# Altium footprint library TarabusLibrary.PcbLib: 591 footprints (part 33 of 37)
Each footprint in its own frame and in the unit in brackets; x right, y up, seen from the top. Pads: shape width x height; smd on the part's side, far side on the other; paste and mask are expansions set on the pad; w line width, h text height; cw(c..) or ccw(c..) is an arc to the next point about the centre after c.
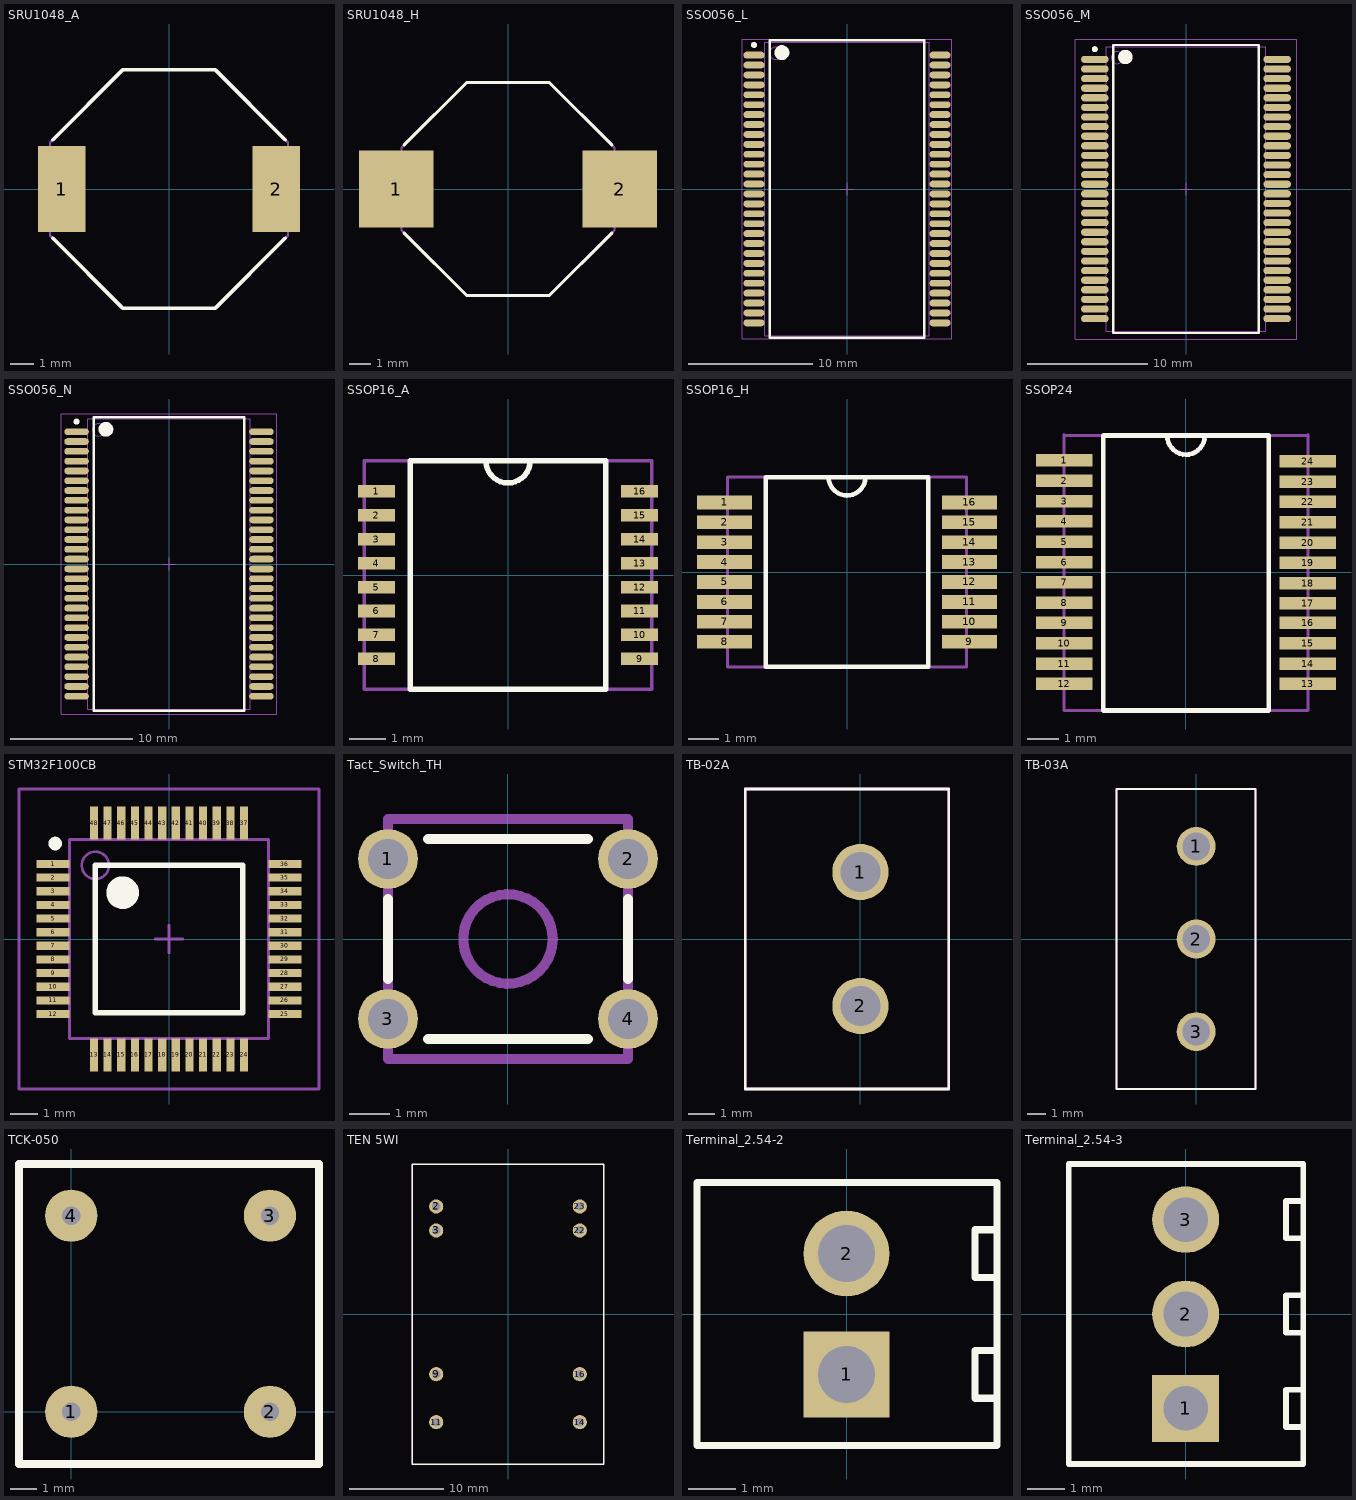
[diagram p32: the footprints below, top view; thin cyan lines are the x and y axes]

## SRU1048_A [mm]
height 5.1
pads (2):
  rect 2x3.6 smd: 1(-4.5,0) 2(4.5,0)
Top Overlay:
  lines w0.15: -4.875,-2.075 -1.95,-5 1.95,-5 4.875,-2.075 ; -4.875,2.075 -1.95,5 1.95,5 4.875,2.075
Mechanical 7:
  lines w0.1: -5,-1.95 -5,1.95 -1.95,5 1.95,5 5,1.95 5,-1.95 1.95,-5 -1.95,-5 -5,-1.95
Mechanical 10:
  text ".Comment" at -1.235,5.625 h0.6
  text ".Designator" at -1.235,6.315 h0.8
3D body: height 5.1, standoff 0, extent -5,-5 5,5

## SRU1048_H [mm]
height 5.1
pads (2):
  rect 3.5x3.6 smd: 1(-5.25,0) 2(5.25,0)
Top Overlay:
  lines w0.15: -4.875,-2.075 -1.95,-5 1.95,-5 4.875,-2.075 ; -4.875,2.075 -1.95,5 1.95,5 4.875,2.075
Mechanical 7:
  lines w0.1: -5,-1.95 -1.95,-5 1.95,-5 5,-1.95 5,1.95 1.95,5 -1.95,5 -5,1.95 -5,-1.95
Mechanical 10:
  text ".Designator" at -1.235,6.315 h0.8
  text ".Comment" at -1.235,5.625 h0.6
3D body: height 5.1, standoff 0, extent -5,-5 5,5

## SSO056_L [mm] "56-Pin Small Outline Package 0.8 mm Pitch, IPC High Density"
height 2
pads (56):
  oval 1.7x0.55 smd: 1(-7.5,10.8) 2(-7.5,10) 3(-7.5,9.2) 4(-7.5,8.4) 5(-7.5,7.6) 6(-7.5,6.8) 7(-7.5,6) 8(-7.5,5.2) 9(-7.5,4.4) 10(-7.5,3.6) 11(-7.5,2.8) 12(-7.5,2) 13(-7.5,1.2) 14(-7.5,0.4) 15(-7.5,-0.4) 16(-7.5,-1.2) 17(-7.5,-2) 18(-7.5,-2.8) 19(-7.5,-3.6) 20(-7.5,-4.4) 21(-7.5,-5.2) 22(-7.5,-6) 23(-7.5,-6.8) 24(-7.5,-7.6) 25(-7.5,-8.4) 26(-7.5,-9.2) 27(-7.5,-10) 28(-7.5,-10.8) 29(7.5,-10.8) 30(7.5,-10) 31(7.5,-9.2) 32(7.5,-8.4) 33(7.5,-7.6) 34(7.5,-6.8) 35(7.5,-6) 36(7.5,-5.2) 37(7.5,-4.4) 38(7.5,-3.6) 39(7.5,-2.8) 40(7.5,-2) 41(7.5,-1.2) 42(7.5,-0.4) 43(7.5,0.4) 44(7.5,1.2) 45(7.5,2) 46(7.5,2.8) 47(7.5,3.6) 48(7.5,4.4) 49(7.5,5.2) 50(7.5,6) 51(7.5,6.8) 52(7.5,7.6) 53(7.5,8.4) 54(7.5,9.2) 55(7.5,10) 56(7.5,10.8)
Top Overlay:
  circle w0.25: c-7.5,11.625 r0.125
  circle w0.6: c-5.25,11 r0.3
  lines w0.2: -6.25,-12 -6.25,12 6.25,12 6.25,-12 -6.25,-12
Mechanical 13:
  circle w0.1: c-5.75,10.95 r0.5
  lines w0.1: -6.65,-11.85 -6.65,11.85 6.65,11.85 6.65,-11.85 -6.65,-11.85
Mechanical 15:
  lines w0.1: -0.5,0 0.5,0 ; 0,-0.5 0,0.5 ; -8.45,-12.1 -8.45,12.1 8.45,12.1 8.45,-12.1 -8.45,-12.1
3D body: height 2, standoff 0, extent -6.65,-11.85 6.65,11.85

## SSO056_M [mm] "56-Pin Small Outline Package 0.8 mm Pitch, IPC Low Density"
height 2
pads (56):
  oval 2.3x0.6 smd: 1(-7.6,10.8) 2(-7.6,10) 3(-7.6,9.2) 4(-7.6,8.4) 5(-7.6,7.6) 6(-7.6,6.8) 7(-7.6,6) 8(-7.6,5.2) 9(-7.6,4.4) 10(-7.6,3.6) 11(-7.6,2.8) 12(-7.6,2) 13(-7.6,1.2) 14(-7.6,0.4) 15(-7.6,-0.4) 16(-7.6,-1.2) 17(-7.6,-2) 18(-7.6,-2.8) 19(-7.6,-3.6) 20(-7.6,-4.4) 21(-7.6,-5.2) 22(-7.6,-6) 23(-7.6,-6.8) 24(-7.6,-7.6) 25(-7.6,-8.4) 26(-7.6,-9.2) 27(-7.6,-10) 28(-7.6,-10.8) 29(7.6,-10.8) 30(7.6,-10) 31(7.6,-9.2) 32(7.6,-8.4) 33(7.6,-7.6) 34(7.6,-6.8) 35(7.6,-6) 36(7.6,-5.2) 37(7.6,-4.4) 38(7.6,-3.6) 39(7.6,-2.8) 40(7.6,-2) 41(7.6,-1.2) 42(7.6,-0.4) 43(7.6,0.4) 44(7.6,1.2) 45(7.6,2) 46(7.6,2.8) 47(7.6,3.6) 48(7.6,4.4) 49(7.6,5.2) 50(7.6,6) 51(7.6,6.8) 52(7.6,7.6) 53(7.6,8.4) 54(7.6,9.2) 55(7.6,10) 56(7.6,10.8)
Top Overlay:
  circle w0.6: c-5.05,11 r0.3
  circle w0.25: c-7.6,11.65 r0.125
  lines w0.2: -6.05,-12 6.05,-12 6.05,12 -6.05,12 -6.05,-12
Mechanical 13:
  circle w0.1: c-5.75,10.95 r0.5
  lines w0.1: -6.65,-11.85 6.65,-11.85 6.65,11.85 -6.65,11.85 -6.65,-11.85
Mechanical 15:
  lines w0.1: -0.5,0 0.5,0 ; 0,-0.5 0,0.5 ; -9.25,-12.5 9.25,-12.5 9.25,12.5 -9.25,12.5 -9.25,-12.5
3D body: height 2, standoff 0, extent -6.65,-11.85 6.65,11.85

## SSO056_N [mm] "56-Pin Small Outline Package 0.8 mm Pitch, IPC Medium Density"
height 2
pads (56):
  oval 2x0.55 smd: 1(-7.55,10.8) 2(-7.55,10) 3(-7.55,9.2) 4(-7.55,8.4) 5(-7.55,7.6) 6(-7.55,6.8) 7(-7.55,6) 8(-7.55,5.2) 9(-7.55,4.4) 10(-7.55,3.6) 11(-7.55,2.8) 12(-7.55,2) 13(-7.55,1.2) 14(-7.55,0.4) 15(-7.55,-0.4) 16(-7.55,-1.2) 17(-7.55,-2) 18(-7.55,-2.8) 19(-7.55,-3.6) 20(-7.55,-4.4) 21(-7.55,-5.2) 22(-7.55,-6) 23(-7.55,-6.8) 24(-7.55,-7.6) 25(-7.55,-8.4) 26(-7.55,-9.2) 27(-7.55,-10) 28(-7.55,-10.8) 29(7.55,-10.8) 30(7.55,-10) 31(7.55,-9.2) 32(7.55,-8.4) 33(7.55,-7.6) 34(7.55,-6.8) 35(7.55,-6) 36(7.55,-5.2) 37(7.55,-4.4) 38(7.55,-3.6) 39(7.55,-2.8) 40(7.55,-2) 41(7.55,-1.2) 42(7.55,-0.4) 43(7.55,0.4) 44(7.55,1.2) 45(7.55,2) 46(7.55,2.8) 47(7.55,3.6) 48(7.55,4.4) 49(7.55,5.2) 50(7.55,6) 51(7.55,6.8) 52(7.55,7.6) 53(7.55,8.4) 54(7.55,9.2) 55(7.55,10) 56(7.55,10.8)
Top Overlay:
  circle w0.25: c-7.55,11.625 r0.125
  circle w0.6: c-5.15,11 r0.3
  lines w0.2: -6.15,-12 -6.15,12 6.15,12 6.15,-12 -6.15,-12
Mechanical 13:
  circle w0.1: c-5.75,10.95 r0.5
  lines w0.1: -6.65,-11.85 -6.65,11.85 6.65,11.85 6.65,-11.85 -6.65,-11.85
Mechanical 15:
  lines w0.1: -0.5,0 0.5,0 ; 0,-0.5 0,0.5 ; -8.8,-12.25 -8.8,12.25 8.8,12.25 8.8,-12.25 -8.8,-12.25
3D body: height 2, standoff 0, extent -6.65,-11.85 6.65,11.85

## SSOP16_A [mm]
height 1.99
pads (16):
  rect 1x0.34 smd: 1(-3.57,2.275) 2(-3.57,1.625) 3(-3.57,0.975) 4(-3.57,0.325) 5(-3.57,-0.325) 6(-3.57,-0.975) 7(-3.57,-1.625) 8(-3.57,-2.275) 9(3.57,-2.275) 10(3.57,-1.625) 11(3.57,-0.975) 12(3.57,-0.325) 13(3.57,0.325) 14(3.57,0.975) 15(3.57,1.625) 16(3.57,2.275)
Top Overlay:
  lines w0.15: -0.6,3.1 ccw(c0,3.1) 0.6,3.09 ; -2.65,-3.1 2.65,-3.1 2.65,3.1 -2.65,3.1 -2.65,-3.1
Mechanical 7:
  lines w0.1: -2.65,-3.1 -2.65,3.1 ; -0.6,3.1 ccw(c0,3.1) 0.6,3.09 ; 2.65,-3.1 2.65,3.1 ; -3.9,-3.1 -3.9,3.1 3.9,3.1 3.9,-3.1 -3.9,-3.1
Mechanical 10:
  text ".Comment" at -1.02,-3.71 h0.6
  text ".Designator" at -1.23,3.46 h0.8
3D body: height 0.75, standoff 0, extent 2.65,-3.1 3.9,3.1
3D body: height 0.75, standoff 0, extent -3.9,-3.1 -2.65,3.1
3D body: height 1.99, standoff 0, extent -2.65,-3.1 2.65,3.1

## SSOP16_H [mm]
height 1.99
pads (16):
  rect 1.8x0.45 smd: 1(-4,2.275) 2(-4,1.625) 3(-4,0.975) 4(-4,0.325) 5(-4,-0.325) 6(-4,-0.975) 7(-4,-1.625) 8(-4,-2.275) 9(4,-2.275) 10(4,-1.625) 11(4,-0.975) 12(4,-0.325) 13(4,0.325) 14(4,0.975) 15(4,1.625) 16(4,2.275)
Top Overlay:
  lines w0.15: -0.6,3.1 ccw(c0,3.1) 0.6,3.09 ; -2.65,-3.1 -2.65,3.1 2.65,3.1 2.65,-3.1 -2.65,-3.1
Mechanical 7:
  lines w0.1: -2.65,-3.1 -2.65,3.1 ; -0.6,3.1 ccw(c0,3.1) 0.6,3.09 ; 2.65,-3.1 2.65,3.1 ; -3.9,-3.1 -3.9,3.1 3.9,3.1 3.9,-3.1 -3.9,-3.1
Mechanical 10:
  text ".Designator" at -1.23,3.46 h0.8
  text ".Comment" at -0.67,-3.72 h0.6
3D body: height 1.99, standoff 0, extent -2.65,-3.1 2.65,3.1
3D body: height 0.75, standoff 0, extent -3.9,-3.1 -2.65,3.1
3D body: height 0.75, standoff 0, extent 2.65,-3.1 3.9,3.1

## SSOP24 [mm]
height 1.85
pads (24):
  rect 1.8x0.4 smd: 1(-3.9,3.575) 2(-3.9,2.925) 3(-3.9,2.275) 4(-3.9,1.625) 5(-3.9,0.975) 6(-3.9,0.325) 7(-3.9,-0.325) 8(-3.9,-0.975) 9(-3.9,-1.625) 10(-3.9,-2.275) 11(-3.9,-2.925) 12(-3.9,-3.575) 13(3.9,-3.575) 14(3.9,-2.925) 15(3.9,-2.275) 16(3.9,-1.625) 17(3.9,-1) 18(3.9,-0.35) 19(3.9,0.3) 20(3.9,0.95) 21(3.9,1.6) 22(3.9,2.25) 23(3.9,2.9) 24(3.9,3.55)
Top Overlay:
  lines w0.15: -0.6,4.36 ccw(c0,4.36) 0.6,4.35 ; -2.65,-4.425 2.65,-4.425 2.65,4.375 -2.65,4.375 -2.65,-4.425
Mechanical 7:
  lines w0.1: -3.9,4.375 3.9,4.375 ; -3.9,4.4 -3.9,-4.425 3.9,-4.425 3.9,4.4 ; -2.65,-1.8 -2.65,4.35 ; -0.6,4.4 ccw(c0,4.4) 0.6,4.39 ; 2.65,-1.8 2.65,4.4
Mechanical 10:
  text ".Comment" at -0.95,-5.05 h0.6
  text ".Designator" at -1.5,4.725 h0.8
3D body: height 0.75, standoff 0, extent 2.65,-4.425 3.9,4.4
3D body: height 0.75, standoff 0, extent -3.9,-4.425 -2.65,4.4
3D body: height 1.99, standoff 0, extent -2.65,-4.425 2.65,4.45

## STM32F100CB [mm] "TSQFP, 48-Leads, Body 9,7x9,7mm (max), Pitch 0,50mm, IPC Medium Density"
height 1.6
pads (48):
  rect 1.2x0.3 smd: 1(-4.25,2.75) 2(-4.25,2.25) 3(-4.25,1.75) 4(-4.25,1.25) 5(-4.25,0.75) 6(-4.25,0.25) 7(-4.25,-0.25) 8(-4.25,-0.75) 9(-4.25,-1.25) 10(-4.25,-1.75) 11(-4.25,-2.25) 12(-4.25,-2.75) 25(4.25,-2.75) 26(4.25,-2.25) 27(4.25,-1.75) 28(4.25,-1.25) 29(4.25,-0.75) 30(4.25,-0.25) 31(4.25,0.25) 32(4.25,0.75) 33(4.25,1.25) 34(4.25,1.75) 35(4.25,2.25) 36(4.25,2.75)
  rect 0.3x1.2 smd: 13(-2.75,-4.25) 14(-2.25,-4.25) 15(-1.75,-4.25) 16(-1.25,-4.25) 17(-0.75,-4.25) 18(-0.25,-4.25) 19(0.25,-4.25) 20(0.75,-4.25) 21(1.25,-4.25) 22(1.75,-4.25) 23(2.25,-4.25) 24(2.75,-4.25) 37(2.75,4.25) 38(2.25,4.25) 39(1.75,4.25) 40(1.25,4.25) 41(0.75,4.25) 42(0.25,4.25) 43(-0.25,4.25) 44(-0.75,4.25) 45(-1.25,4.25) 46(-1.75,4.25) 47(-2.25,4.25) 48(-2.75,4.25)
Top Overlay:
  circle w0.6: c-1.7,1.7 r0.3
  circle w0.25: c-4.175,3.5 r0.125
  lines w0.2: -2.7,-2.7 2.7,-2.7 2.7,2.7 -2.7,2.7 -2.7,-2.7
Mechanical 13:
  circle w0.1: c-2.7,2.7 r0.5
  lines w0.1: -3.65,-3.65 3.65,-3.65 3.65,3.65 -3.65,3.65 -3.65,-3.65
Mechanical 15:
  lines w0.1: -0.5,0 0.5,0 ; 0,-0.5 0,0.5 ; -5.5,-5.5 5.5,-5.5 5.5,5.5 -5.5,5.5 -5.5,-5.5
3D body: height 1.6, standoff 0.05, extent -3.65,-3.65 3.65,3.65

## Tact_Switch_TH [mm]
height 5
pads (4):
  round 1.5 hole 1 mask+0.075: 1(-3,2) 2(3,2) 3(-3,-2) 4(3,-2)
Top Overlay:
  lines w0.254: -3,-1 -3,1 ; -2,-2.5 2,-2.5 ; -2,2.5 2,2.5 ; 3,-1 3,1
Mechanical 9:
  circle w0.254: c0,0 r1.118
  lines w0.254: -3,-3 3,-3 3,3 -3,3 -3,-3
3D body: height 4, standoff 0, extent -1.118,-1.118 1.118,1.118
3D body: height 3.5, standoff 0.05, extent -3,-3 3,3

## TB-02A [mm]
pads (2):
  round 2.1 hole 1.5: 1(0,2.5) 2(0,-2.5)
Top Overlay:
  lines w0.1: -4.3,-5.6 -4.3,5.6 3.3,5.6 3.3,-5.6 -4.3,-5.6
Mechanical 7:
  lines w0.1: -4.3,-5.6 -4.3,5.6 3.3,5.6 3.3,-5.6 -4.3,-5.6
3D body "c-1776244-2-o-3d.stp": height 10, standoff -3.5, extent -4.25,-5.58 3.25,5.58

## TB-03A [mm]
pads (3):
  round 2.1 hole 1.5: 1(0,5) 2(0,0) 3(0,-5)
Top Overlay:
  lines w0.1: -4.3,-8.1 -4.3,8.1 3.2,8.1 3.2,-8.1 -4.3,-8.1
Mechanical 7:
  lines w0.1: -4.3,-8.1 -4.3,8.1 3.2,8.1 3.2,-8.1 -4.3,-8.1
3D body "c-1776244-3-o-3d.stp": height 10, standoff -3.5, extent -4.3,-8.08 3.2,8.08

## TCK-050 [mm]
pads (4):
  round 2 hole 0.7: 1(0,0) 2(7.62,0) 3(7.62,7.52) 4(0,7.52)
Top Overlay:
  lines w0.3: -2,-2 9.5,-2 9.5,9.5 -2,9.5 -2,-2
Mechanical 7:
  lines w0.3: -2,-2 9.5,-2 9.5,9.5 -2,9.5 -2,-2
Mechanical 10:
  text ".Designator" at 6.5,11 h0.8
  text ".Comment" at 6.5,10 h0.6
3D body: height 8.8, standoff 0, extent -2,-2 9.5,9.5

## TEN 5WI [mm]
height 10.2
pads (8):
  round 1.5 hole 0.9: 2(-7.61,11.43) 3(-7.61,8.89) 9(-7.61,-6.35) 11(-7.61,-11.43) 14(7.61,-11.43) 16(7.61,-6.35) 22(7.61,8.89) 23(7.61,11.43)
Top Overlay:
  lines w0.15: -10.15,-15.87 10.15,-15.87 10.15,15.93 -10.15,15.93 -10.15,-15.87
Mechanical 7:
  lines w0.1: -10.15,-15.87 -10.15,15.93 10.15,15.93 10.15,-15.87 -10.15,-15.87
Mechanical 10:
  text ".Designator" at -1.15,1.44 h0.8
  text ".Comment" at -1.075,0.315 h0.6
3D body: height 10.2, standoff 0.1, extent -8.5,-14.5 8.5,14.5
3D body: height 10.1, standoff 0, extent -10.15,-15.9 10.15,15.9

## Terminal_2.54-2 [mm]
height 8.5
pads (2):
  rect 1.8x1.8 hole 1.2: 1(0,-1.27)
  round 1.8 hole 1.2: 2(0,1.27)
Top Overlay:
  lines w0.15: 3.16,-1.77 2.7,-1.77 2.7,-0.77 3.16,-0.77 ; 3.16,0.77 2.7,0.77 2.7,1.77 3.16,1.77 ; -3.14,-2.765 -3.14,2.765 3.16,2.765 3.16,-2.765 -3.14,-2.765
Mechanical 7:
  lines w0.1: 3.16,-1.77 2.7,-1.77 2.7,-0.77 3.16,-0.77 ; 3.16,0.77 2.7,0.77 2.7,1.77 3.16,1.77 ; -3.14,-2.765 3.16,-2.765 3.16,2.765 -3.14,2.765 -3.14,-2.765
Mechanical 10:
  text ".Comment" at -1.15,3.275 h0.6
  text ".Designator" at -1.175,3.975 h0.8
3D body: height 8.5, standoff 0, extent -3.14,-2.765 3.16,2.765

## Terminal_2.54-3 [mm]
height 8.5
pads (3):
  rect 1.8x1.8 hole 1.2: 1(0,-2.54)
  round 1.8 hole 1.2: 2(0,0) 3(0,2.54)
Top Overlay:
  lines w0.15: 3.16,-3.04 2.7,-3.04 2.7,-2.04 3.16,-2.04 ; 3.16,-0.5 2.7,-0.5 2.7,0.5 3.16,0.5 ; 3.16,2.04 2.7,2.04 2.7,3.04 3.16,3.04 ; -3.14,-4.035 3.16,-4.035 3.16,4.035 -3.14,4.035 -3.14,-4.035
Mechanical 7:
  lines w0.1: 3.16,-3.04 2.7,-3.04 2.7,-2.04 3.16,-2.04 ; 3.16,-0.5 2.7,-0.5 2.7,0.5 3.16,0.5 ; 3.16,2.04 2.7,2.04 2.7,3.04 3.16,3.04 ; -3.14,-4.035 -3.14,4.035 3.16,4.035 3.16,-4.035 -3.14,-4.035
Mechanical 10:
  text ".Designator" at -1.175,5.245 h0.8
  text ".Comment" at -1.15,4.545 h0.6
3D body: height 8.5, standoff 0, extent -3.14,-4.035 3.16,4.035